# Altium footprint library Indruino.PcbLib: 383 footprints (part 16 of 24)
Each footprint in its own frame and in the unit in brackets; x right, y up, seen from the top. Pads: shape width x height; smd on the part's side, far side on the other; paste and mask are expansions set on the pad; w line width, h text height; cw(c..) or ccw(c..) is an arc to the next point about the centre after c.
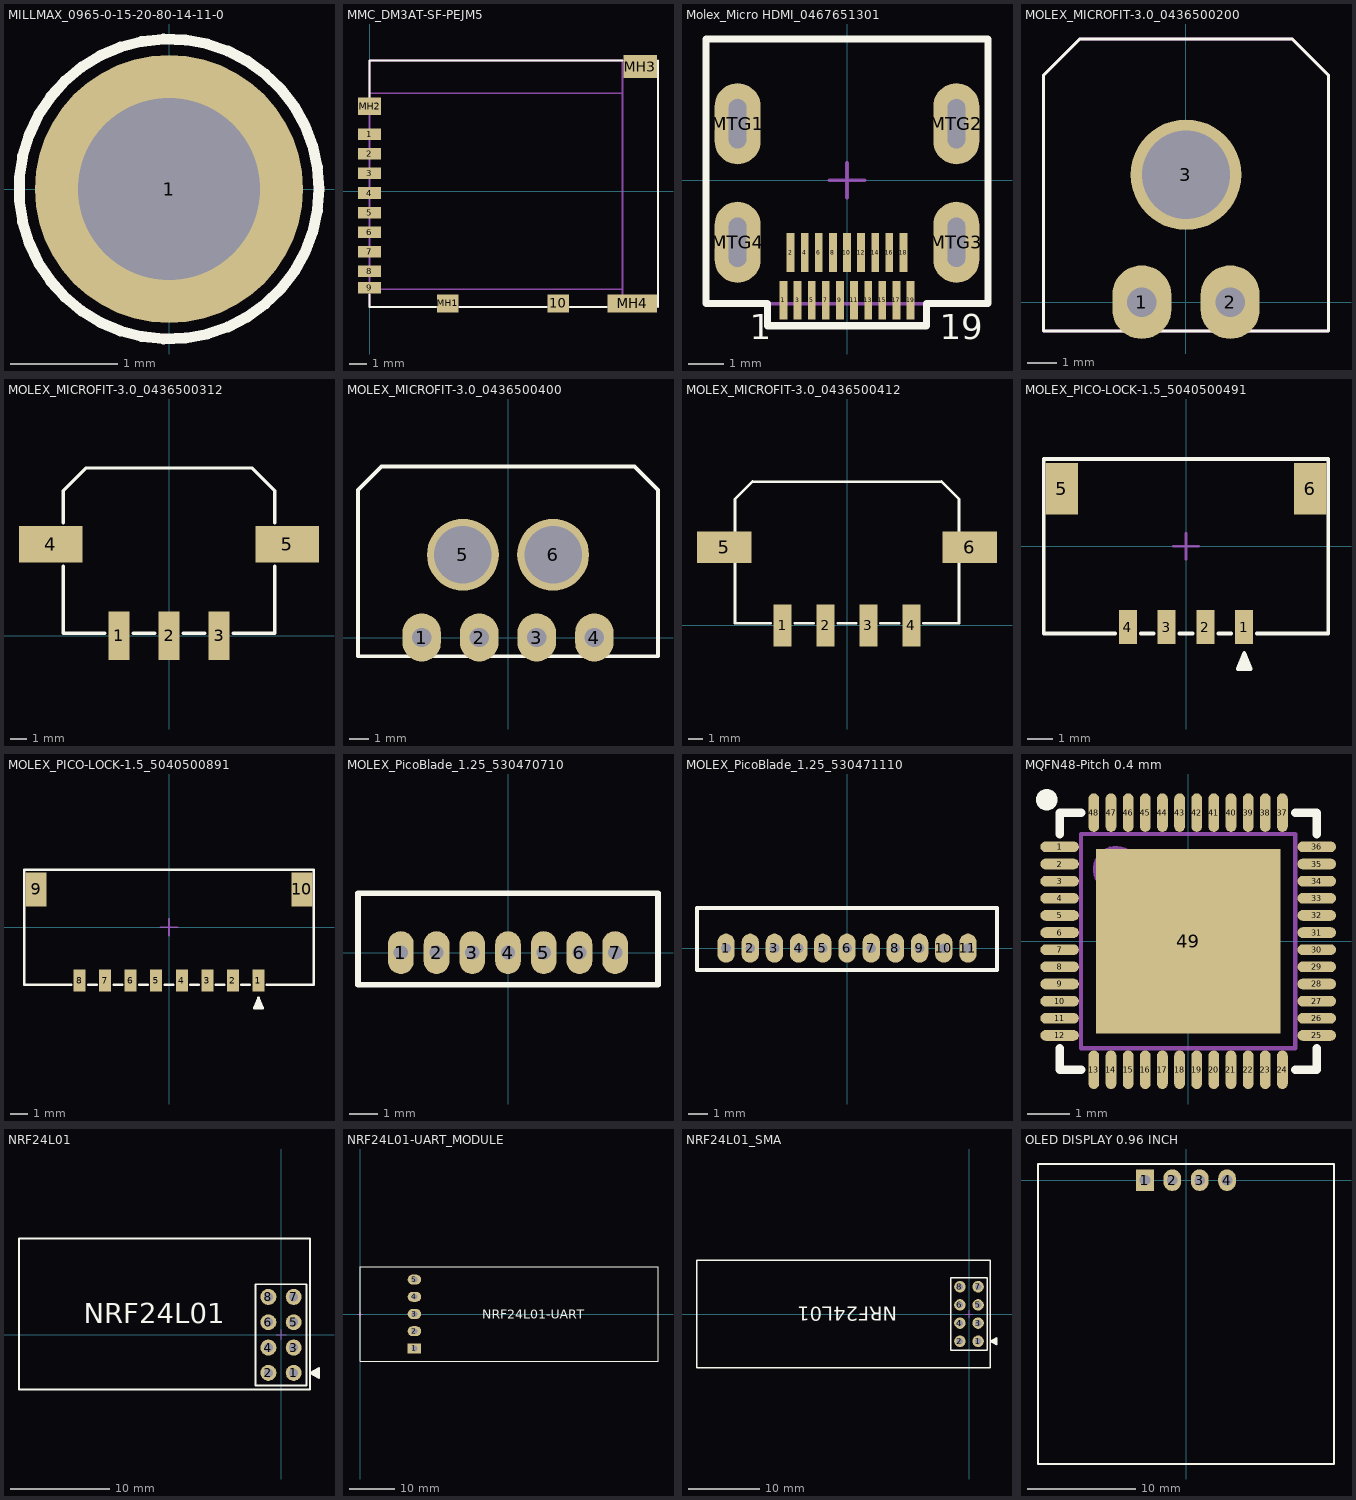
[diagram p15: the footprints below, top view; thin cyan lines are the x and y axes]

## MILLMAX_0965-0-15-20-80-14-11-0 [mm]
pads (1):
  round 2.5 hole 1.7: 1(0,0)
Top Overlay:
  circle w0.1: c0,0 r1.4
3D body "mill-max-0965-0-15-20-80-14-11-0.STEP": height 0.54, standoff -2, extent -0.914,-0.914 0.914,0.914

## MMC_DM3AT-SF-PEJM5 [mm]
pads (14):
  rect 1.3x0.65 smd: 1(0,3.2) 2(0,2.1) 3(0,1) 4(0,-0.1) 5(0,-1.2) 6(0,-2.3) 7(0,-3.4) 8(0,-4.5) 9(0,-5.425)
  rect 1.2x1 smd: 10(10.6,-6.3) MH1(4.4,-6.3)
  rect 1.3x1 smd: MH2(0,4.775)
  rect 1.9x1.3 smd: MH3(15.2,7)
  rect 2.8x1 smd: MH4(14.75,-6.3)
Top Overlay:
  lines w0.1: 0,-5.8 0,-6.5 3.75,-6.5 ; 0,5.3 0,7.35 14.2,7.35 ; 5.05,-6.5 9.95,-6.5 ; 11.25,-6.5 13.3,-6.5 ; 16.2,-6.5 16.2,7.35
Mechanical 13:
  lines w0.1: 0,-5.5 14.2,-5.5 ; 0,5.5 14.2,5.5 ; 0,-6.5 14.2,-6.5 14.2,7.35 0,7.35 0,-6.5
Mechanical 15:
  lines w0.1: -0.5,0 0.5,0 ; 0,-0.5 0,0.5
3D body "DM3AT-SF-PEJM5.stp": height 1.68, standoff 0, extent 0,-6.475 16.15,7.375
3D body "User Library-microsd card.step": height 1.6, standoff 0.6, extent 3.5,-5.5 18.5,5.512

## Molex_Micro HDMI_0467651301 [mm]
pads (23):
  rect 0.22x1.1 smd: 1(-1.8,-3.4) 2(-1.6,-2.05) 3(-1.4,-3.4) 4(-1.2,-2.05) 5(-1,-3.4) 6(-0.8,-2.05) 7(-0.6,-3.4) 8(-0.4,-2.05) 9(-0.2,-3.4) 10(0,-2.05) 11(0.2,-3.4) 12(0.4,-2.05) 13(0.6,-3.4) 14(0.8,-2.05) 15(1,-3.4) 16(1.2,-2.05) 17(1.4,-3.4) 18(1.6,-2.05) 19(1.8,-3.4)
  oval 1.3x2.3 hole 1.4 slot 0.5 at 0 deg: MTG1(-3.1,1.6) MTG2(3.1,1.6) MTG3(3.1,-1.76) MTG4(-3.1,-1.76)
Top Overlay:
  lines w0.2: -4,-3.5 -2.25,-3.5 -2.25,-4.125 2.25,-4.125 2.25,-3.5 4,-3.5 4,-1.45 4,4 -4,4 -4,-1.45 -4,-3.5
  text "19" at 2.625,-4.5 h0.7
  text "1" at -2.75,-4.5 h0.7
Mechanical 13:
  lines w0.1: -4,-3.5 4,-3.5 4,-1.45 4,4 -4,4 -4,-1.45 -4,-3.5
Mechanical 15:
  lines w0.1: -0.5,0 0.5,0 ; 0,-0.5 0,0.5
3D body "467651301.stp": height 2.97, standoff -0.55, extent -3.25,-3.5 3.25,4

## MOLEX_MICROFIT-3.0_0436500200 [mm]
pads (3):
  oval 2x2.5 hole 1: 1(-1.5,0) 2(1.5,0)
  round 3.75 hole 3: 3(0,4.32)
Top Overlay:
  lines w0.1: -3.602,8.92 3.602,8.92 ; -3.602,8.923 -4.825,7.7 -4.825,-0.98 4.825,-0.98 4.825,7.7 3.602,8.923
Mechanical 13:
  lines w0.1: -3.602,8.92 3.603,8.92 ; -3.602,8.923 -4.825,7.7 -4.825,-0.98 4.825,-0.98 4.825,7.7 3.603,8.923
3D body "436500200.stp": height 5.64, standoff -3.27, extent -4.825,-0.98 4.825,8.92
3D body "436450200.stp": height 6.96, standoff -0.14, extent -4.14,2.58 4.15,16.58

## MOLEX_MICROFIT-3.0_0436500312 [mm]
pads (5):
  rect 1.27x2.92 smd: 1(-3,0) 2(0,0) 3(3,0)
  rect 3.8x2.2 smd: 4(-7.085,5.47) 5(7.085,5.47)
Top Overlay:
  lines w0.2: -6.325,4.175 -6.325,0.15 -3.85,0.15 ; -6.325,6.775 -6.325,8.675 -4.95,10.05 4.95,10.05 6.325,8.675 6.325,6.775 ; -2.15,0.15 -0.85,0.15 ; 0.85,0.15 2.15,0.15 ; 3.85,0.15 6.325,0.15 6.325,4.175
3D body "436450308.stp": height 7.01, standoff -0.09, extent -4.92,3.7 4.93,17.7
3D body "436500312.stp": height 5.69, standoff 0.01, extent -8.325,-0.69 8.325,10.05

## MOLEX_MICROFIT-3.0_0436500400 [mm]
pads (6):
  oval 2x2.5 hole 1: 1(-4.5,0) 2(-1.5,0) 3(1.5,0) 4(4.5,0)
  round 3.75 hole 3: 5(-2.35,4.32) 6(2.35,4.32)
Top Overlay:
  lines w0.2: -6.602,8.92 6.602,8.92 ; -6.602,8.923 -7.825,7.7 -7.825,-0.98 7.825,-0.98 7.825,7.7 6.602,8.923
3D body "436500400.stp": height 5.64, standoff -3.27, extent -7.825,-0.98 7.825,8.92
3D body "436450400.stp": height 6.96, standoff -0.14, extent -6.42,2.58 6.43,16.58

## MOLEX_MICROFIT-3.0_0436500412 [mm]
pads (6):
  rect 1.27x2.92 smd: 1(-4.5,0) 2(-1.5,0) 3(1.5,0) 4(4.5,0)
  rect 3.8x2.2 smd: 5(-8.585,5.47) 6(8.585,5.47)
Top Overlay:
  lines w0.2: -7.825,8.8 -7.825,0.15 -5.35,0.15 ; -7.825,8.83 -6.602,10.052 ; -6.602,10.05 6.602,10.05 ; -3.65,0.15 -2.35,0.15 ; -0.65,0.15 0.65,0.15 ; 2.35,0.15 3.65,0.15 ; 5.35,0.15 7.825,0.15 7.825,8.8 ; 6.602,10.052 7.825,8.83
3D body "436500412.stp": height 5.64, standoff -0.04, extent -9.825,-0.69 9.825,10.05
3D body "436450400.stp": height 6.96, standoff -0.14, extent -6.42,3.7 6.43,17.7

## MOLEX_PICO-LOCK-1.5_5040500491 [mm]
pads (6):
  rect 0.7x1.3 smd: 1(2.25,-3.125) 2(0.75,-3.125) 3(-0.75,-3.125) 4(-2.25,-3.125)
  rect 1.25x2 smd: 5(-4.8,2.225) 6(4.8,2.225)
Top Overlay:
  region: 2,-4.75 2.25,-4.125 2.5,-4.75
  lines w0.15: -2.75,-3.375 -5.5,-3.375 -5.5,3.375 5.5,3.375 5.5,-3.375 2.75,-3.375 ; -1.75,-3.375 -1.25,-3.375 ; -0.25,-3.375 0.25,-3.375 ; 1.25,-3.375 1.75,-3.375 ; 2,-4.75 2.5,-4.75 2.25,-4.125 2,-4.75
Mechanical 15:
  lines w0.1: -0.5,0 0.5,0 ; 0,-0.5 0,0.5
3D body "5040500491.stp": height 1.98, standoff -0.02, extent -5.275,-3.315 5.275,3.125

## MOLEX_PICO-LOCK-1.5_5040500891 [mm]
pads (10):
  rect 0.7x1.3 smd: 1(5.25,-3.125) 2(3.75,-3.125) 3(2.25,-3.125) 4(0.75,-3.125) 5(-0.75,-3.125) 6(-2.25,-3.125) 7(-3.75,-3.125) 8(-5.25,-3.125)
  rect 1.25x2 smd: 9(-7.8,2.225) 10(7.8,2.225)
Top Overlay:
  region: 5,-4.75 5.25,-4.125 5.5,-4.75
  lines w0.15: -5.75,-3.375 -8.5,-3.375 -8.5,3.375 8.5,3.375 8.5,-3.375 5.75,-3.375 ; -4.75,-3.375 -4.25,-3.375 ; -3.25,-3.375 -2.75,-3.375 ; -1.75,-3.375 -1.25,-3.375 ; -0.25,-3.375 0.25,-3.375 ; 1.25,-3.375 1.75,-3.375 ; 2.75,-3.375 3.25,-3.375 ; 4.25,-3.375 4.75,-3.375 ; 5,-4.75 5.5,-4.75 5.25,-4.125 5,-4.75
Mechanical 15:
  lines w0.1: -0.5,0 0.5,0 ; 0,-0.5 0,0.5
3D body "5040500891.stp": height 1.98, standoff -0.02, extent -8.275,-3.315 8.275,3.125

## MOLEX_PicoBlade_1.25_530470710 [mm] "1.25mm Pitch, PicoBlade PCB Header, Single Row, Vertical, Through Hole, Tin Plating, Friction Lock, 7 Circuits, Tray, 2.30mm PC Tail Length"
pads (7):
  oval 0.9x1.5 hole 0.5: 1(-3.75,0) 2(-2.5,0) 3(-1.25,0) 4(0,0) 5(1.25,0) 6(2.5,0) 7(3.75,0)
Top Overlay:
  lines w0.2: -5.25,-1.125 5.25,-1.125 5.25,2.075 -5.25,2.075 -5.25,-1.125
Mechanical 13:
  lines w0.1: -5.25,-1.125 5.25,-1.125 5.25,2.075 -5.25,2.075 -5.25,-1.125
3D body "530470710.stp": height 4.23, standoff -2.27, extent -5.25,-1.125 5.25,2.075

## MOLEX_PicoBlade_1.25_530471110 [mm] "1.25mm Pitch, PicoBlade PCB Header, Single Row, Vertical, Through Hole, Tin Plating, Friction Lock, 11 Circuits, Tray, 2.30mm PC Tail Length"
pads (11):
  oval 0.9x1.5 hole 0.5: 1(-6.25,0) 2(-5,0) 3(-3.75,0) 4(-2.5,0) 5(-1.25,0) 6(0,0) 7(1.25,0) 8(2.5,0) 9(3.75,0) 10(5,0) 11(6.25,0)
Top Overlay:
  lines w0.2: -7.75,-1.125 7.75,-1.125 7.75,2.075 -7.75,2.075 -7.75,-1.125
Mechanical 13:
  lines w0.1: -7.75,-1.125 7.75,-1.125 7.75,2.075 -7.75,2.075 -7.75,-1.125
3D body "530471110.stp": height 4.23, standoff -2.27, extent -7.75,-1.125 7.75,2.075

## MQFN48-Pitch 0.4 mm [mm]
pads (49):
  oval 0.9x0.25 smd: 1(-3,2.2) 2(-3,1.8) 3(-3,1.4) 4(-3,1) 5(-3,0.6) 6(-3,0.2) 7(-3,-0.2) 8(-3,-0.6) 9(-3,-1) 10(-3,-1.4) 11(-3,-1.8) 12(-3,-2.2) 25(3,-2.2) 26(3,-1.8) 27(3,-1.4) 28(3,-1) 29(3,-0.6) 30(3,-0.2) 31(3,0.2) 32(3,0.6) 33(3,1) 34(3,1.4) 35(3,1.8) 36(3,2.2)
  oval 0.25x0.9 smd: 13(-2.2,-3) 14(-1.8,-3) 15(-1.4,-3) 16(-1,-3) 17(-0.6,-3) 18(-0.2,-3) 19(0.2,-3) 20(0.6,-3) 21(1,-3) 22(1.4,-3) 23(1.8,-3) 24(2.2,-3) 37(2.2,3) 38(1.8,3) 39(1.4,3) 40(1,3) 41(0.6,3) 42(0.2,3) 43(-0.2,3) 44(-0.6,3) 45(-1,3) 46(-1.4,3) 47(-1.8,3) 48(-2.2,3)
  rect 4.3x4.3 smd: 49(0,0)
Top Overlay:
  region: -3.3,3.05 -3.35,3.05 -3.442,3.088 -3.512,3.158 -3.55,3.25 -3.55,3.3 -3.55,3.35 -3.512,3.442 -3.442,3.512 -3.35,3.55 -3.3,3.55 -3.25,3.55 -3.158,3.512 -3.088,3.442 -3.05,3.35 -3.05,3.3 -3.05,3.25 -3.088,3.158 -3.158,3.088 -3.25,3.05
  lines w0.2: -3,-2.5 -3,-3 -2.5,-3 ; -3,2.5 -3,3 -2.5,3 ; 2.5,-3 3,-3 3,-2.5 ; 2.5,3 3,3 3,2.5
Mechanical 13:
  circle w0.1: c-1.675,1.675 r0.5
  lines w0.1: -2.5,-2.5 -2.5,2.5 2.5,2.5 2.5,-2.5 -2.5,-2.5
Mechanical 15:
  lines w0.1: -0.5,0 0.5,0 ; 0,-0.5 0,0.5
3D body "User Library-QFN48.step": height 0.85, standoff -0.02, extent -3.034,-3.021 3.006,3.019

## NRF24L01 [mm]
pads (8):
  round 1.6 hole 0.9: 1(1.27,-3.81) 2(-1.27,-3.81) 3(1.27,-1.27) 4(-1.27,-1.27) 5(1.27,1.27) 6(-1.27,1.27) 7(1.27,3.81) 8(-1.27,3.81)
Top Overlay:
  region: 2.921,-3.81 3.81,-3.302 3.81,-4.318
  lines w0.2: -26.289,-5.461 2.921,-5.461 2.921,9.652 -26.289,9.652 -26.289,-5.461 ; -2.54,-5.08 -2.54,5.08 2.54,5.08 2.54,-5.08 -2.54,-5.08 ; 2.921,-3.81 3.81,-3.302 3.81,-4.318 2.921,-3.81
  text "NRF24L01" at -19.812,1.143 h2
Mechanical 15:
  lines w0.1: -0.5,0 0.5,0 ; 0,-0.5 0,0.5
3D body "User Library-ZL262-4SG.step": height 8.4, standoff -3.15, extent -2.52,-5.08 -0.02,5.08
3D body "User Library-ZL262-4SG.step": height 8.4, standoff -3.15, extent 0.02,-5.08 2.52,5.08
3D body "User Library-NRF24L01.STEP": height 14.7, standoff 2.25, extent -26.15,-5.4 2.85,9.6

## NRF24L01-UART_MODULE [mm]
pads (5):
  rect 3x2.2 hole 1.3: 1(12,-7.62)
  oval 3x2.2 hole 1.3: 2(12,-3.81) 3(12,0) 4(12,3.81) 5(12,7.62)
Top Overlay:
  lines w0.2: 0,-10.5 66,-10.5 66,10.5 0,10.5 0,-10.5
  text "NRF24L01-UART" at 27,-1 h2
Mechanical 15:
  lines w0.1: -0.5,0 0.5,0 ; 0,-0.5 0,0.5
3D body "NRF24L01_UART_BRIDGE_V1I0_BK.step": height 23.47, standoff 1.65, extent 0,-10.5 66,10.5

## NRF24L01_SMA [mm]
pads (8):
  round 1.6 hole 0.9: 1(1.27,-3.81) 2(-1.27,-3.81) 3(1.27,-1.27) 4(-1.27,-1.27) 5(1.27,1.27) 6(-1.27,1.27) 7(1.27,3.81) 8(-1.27,3.81)
Top Overlay:
  region: 3.021,-3.81 3.91,-3.302 3.91,-4.318
  lines w0.2: -38,-7.5 3,-7.5 3,7.5 -38,7.5 -38,-7.5 ; -2.54,-5.08 -2.54,5.08 2.54,5.08 2.54,-5.08 -2.54,-5.08 ; 3.021,-3.81 3.91,-3.302 3.91,-4.318 3.021,-3.81
  text "NRF24L01" at -10,1 h2
Mechanical 15:
  lines w0.1: -0.5,0 0.5,0 ; 0,-0.5 0,0.5
3D body "SMA-KWE-RA-11.STEP": height 10.97, standoff 0, extent -47,-3.125 -30,3.225
3D body "User Library-NRF24L01.STEP": height 6.2, standoff -6.25, extent -26.46,-7.5 2.54,7.5

## OLED DISPLAY 0.96 INCH [mm]
pads (4):
  rect 1.65x2 hole 1: 1(-3.81,0)
  oval 1.65x2 hole 1: 2(-1.27,0) 3(1.27,0) 4(3.81,0)
Top Overlay:
  lines w0.2: -13.7,-26.3 -13.7,1.5 13.7,1.5 13.7,-26.3 -13.7,-26.3
3D body "OLED TFT 0.96 inch 64x128 monochrome.STEP": height 3.6, standoff -8.7, extent -13.65,-26.3 13.65,1.5